# Altium integrated library Weidmueller_OMNIMATE_Power.IntLib: 508 symbols (part 1 of 9)
Pins are listed as number, name and electrical type; pins without a type are passive.

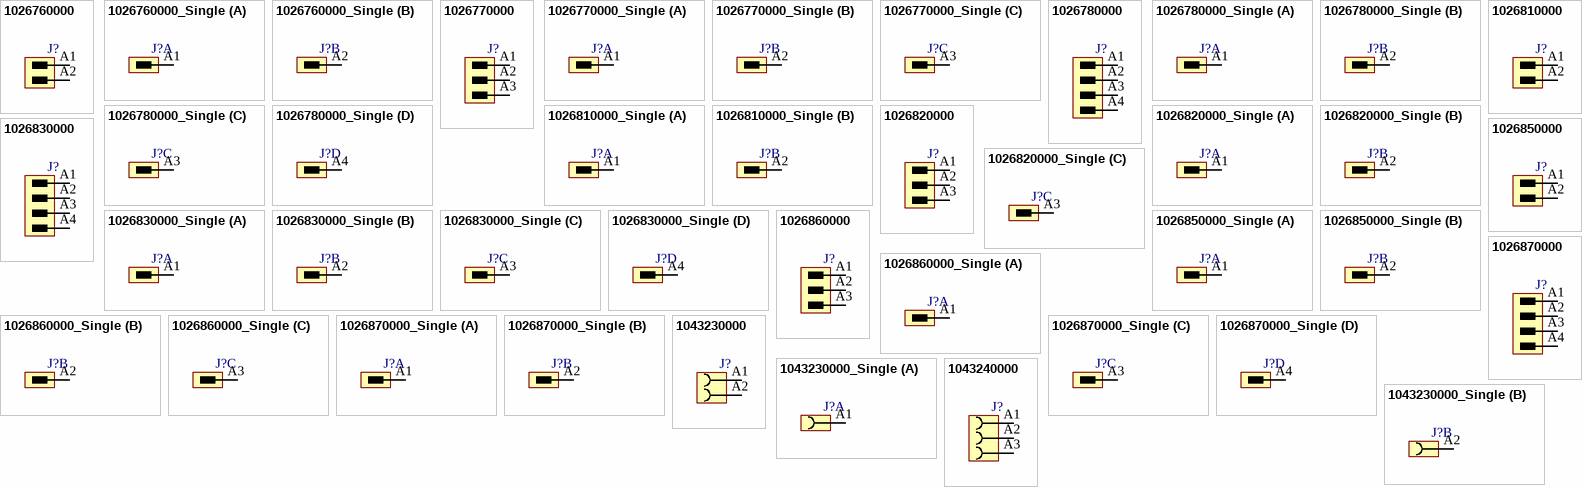
[diagram p0: symbols 1026760000 to 1043240000]

## 1026760000
designator J?
OMNIMATE Power - series BL/SL 7.62HP; PartNumber: 1026760000; Manufacturer: Weidmueller; Short_text_for_material: SL 7.62HP/02/90G 3.2SN BK BX; Side_termination_characteristic: closed side; Mounting_onto_the_PCB: Solder connection; Pitch_mm: 7.62 mm; Pitch_inch: 0.3 inch; No_of_poles: 2; Outgoing_elbow: 90°; Solder_pin_length_mm: 3.2 mm; Contact_material: Cu-Leg; Contact_surface: tinned; Insulating_material: PBT; UL_94_flammability_rating: V-0; Rated_voltage_for_surge_voltage_class_pollution_degree_II_2: 630 V; Rated_voltage_use_group_B_UL_1059: 300 V; Rated_current_use_group_B_UL_1059: 20 A; PackageReference: SL_7_62HP_90G_02; Colour: Black; Packaging: Box; Qty: 100 PCS; Revision: V1; ComponentLink1Description: Manufacturer URL; ComponentLink1URL: http://www.weidmueller.com/; ComponentLink2Description: URL Link1; ComponentLink2URL: http://catalog.weidmueller.com/catalog/Start.do?localeId=en&ObjectID=1026760000
footprint SL_7_62HP_90G_02 (OMNIMATE Power - Serie BL/SL 7.62HP  SL 7.62HP/02/90G 3.2)
pins: A1, A2

## 1026760000_Single
designator J?
OMNIMATE Power - series BL/SL 7.62HP; PartNumber: 1026760000; Manufacturer: Weidmueller; Short_text_for_material: SL 7.62HP/02/90G 3.2SN BK BX; Side_termination_characteristic: closed side; Mounting_onto_the_PCB: Solder connection; Pitch_mm: 7.62 mm; Pitch_inch: 0.3 inch; No_of_poles: 2; Outgoing_elbow: 90°; Solder_pin_length_mm: 3.2 mm; Contact_material: Cu-Leg; Contact_surface: tinned; Insulating_material: PBT; UL_94_flammability_rating: V-0; Rated_voltage_for_surge_voltage_class_pollution_degree_II_2: 630 V; Rated_voltage_use_group_B_UL_1059: 300 V; Rated_current_use_group_B_UL_1059: 20 A; PackageReference: SL_7_62HP_90G_02; Colour: Black; Packaging: Box; Qty: 100 PCS; Revision: V1; ComponentLink1Description: Manufacturer URL; ComponentLink1URL: http://www.weidmueller.com/; ComponentLink2Description: URL Link1; ComponentLink2URL: http://catalog.weidmueller.com/catalog/Start.do?localeId=en&ObjectID=1026760000
footprint SL_7_62HP_90G_02 (OMNIMATE Power - Serie BL/SL 7.62HP  SL 7.62HP/02/90G 3.2)
part A pins: A1
part B pins: A2

## 1026770000
designator J?
OMNIMATE Power - series BL/SL 7.62HP; PartNumber: 1026770000; Manufacturer: Weidmueller; Short_text_for_material: SL 7.62HP/03/90G 3.2SN BK BX; Side_termination_characteristic: closed side; Mounting_onto_the_PCB: Solder connection; Pitch_mm: 7.62 mm; Pitch_inch: 0.3 inch; No_of_poles: 3; Outgoing_elbow: 90°; Solder_pin_length_mm: 3.2 mm; Contact_material: Cu-Leg; Contact_surface: tinned; Insulating_material: PBT; UL_94_flammability_rating: V-0; Rated_voltage_for_surge_voltage_class_pollution_degree_II_2: 630 V; Rated_voltage_use_group_B_UL_1059: 300 V; Rated_current_use_group_B_UL_1059: 20 A; PackageReference: SL_7_62HP_90G_03; Colour: Black; Packaging: Box; Qty: 100 PCS; Revision: V1; ComponentLink1Description: Manufacturer URL; ComponentLink1URL: http://www.weidmueller.com/; ComponentLink2Description: URL Link1; ComponentLink2URL: http://catalog.weidmueller.com/catalog/Start.do?localeId=en&ObjectID=1026770000
footprint SL_7_62HP_90G_03 (OMNIMATE Power - Serie BL/SL 7.62HP  SL 7.62HP/03/90G 3.2)
pins: A1, A2, A3

## 1026770000_Single
designator J?
OMNIMATE Power - series BL/SL 7.62HP; PartNumber: 1026770000; Manufacturer: Weidmueller; Short_text_for_material: SL 7.62HP/03/90G 3.2SN BK BX; Side_termination_characteristic: closed side; Mounting_onto_the_PCB: Solder connection; Pitch_mm: 7.62 mm; Pitch_inch: 0.3 inch; No_of_poles: 3; Outgoing_elbow: 90°; Solder_pin_length_mm: 3.2 mm; Contact_material: Cu-Leg; Contact_surface: tinned; Insulating_material: PBT; UL_94_flammability_rating: V-0; Rated_voltage_for_surge_voltage_class_pollution_degree_II_2: 630 V; Rated_voltage_use_group_B_UL_1059: 300 V; Rated_current_use_group_B_UL_1059: 20 A; PackageReference: SL_7_62HP_90G_03; Colour: Black; Packaging: Box; Qty: 100 PCS; Revision: V1; ComponentLink1Description: Manufacturer URL; ComponentLink1URL: http://www.weidmueller.com/; ComponentLink2Description: URL Link1; ComponentLink2URL: http://catalog.weidmueller.com/catalog/Start.do?localeId=en&ObjectID=1026770000
footprint SL_7_62HP_90G_03 (OMNIMATE Power - Serie BL/SL 7.62HP  SL 7.62HP/03/90G 3.2)
part A pins: A1
part B pins: A2
part C pins: A3

## 1026780000
designator J?
OMNIMATE Power - series BL/SL 7.62HP; PartNumber: 1026780000; Manufacturer: Weidmueller; Short_text_for_material: SL 7.62HP/04/90G 3.2SN BK BX; Side_termination_characteristic: closed side; Mounting_onto_the_PCB: Solder connection; Pitch_mm: 7.62 mm; Pitch_inch: 0.3 inch; No_of_poles: 4; Outgoing_elbow: 90°; Solder_pin_length_mm: 3.2 mm; Contact_material: Cu-Leg; Contact_surface: tinned; Insulating_material: PBT; UL_94_flammability_rating: V-0; Rated_voltage_for_surge_voltage_class_pollution_degree_II_2: 630 V; Rated_voltage_use_group_B_UL_1059: 300 V; Rated_current_use_group_B_UL_1059: 20 A; PackageReference: SL_7_62HP_90G_04; Colour: Black; Packaging: Box; Qty: 100 PCS; Revision: V1; ComponentLink1Description: Manufacturer URL; ComponentLink1URL: http://www.weidmueller.com/; ComponentLink2Description: URL Link1; ComponentLink2URL: http://catalog.weidmueller.com/catalog/Start.do?localeId=en&ObjectID=1026780000
footprint SL_7_62HP_90G_04 (OMNIMATE Power - Serie BL/SL 7.62HP  SL 7.62HP/04/90G 3.2)
pins: A1, A2, A3, A4

## 1026780000_Single
designator J?
OMNIMATE Power - series BL/SL 7.62HP; PartNumber: 1026780000; Manufacturer: Weidmueller; Short_text_for_material: SL 7.62HP/04/90G 3.2SN BK BX; Side_termination_characteristic: closed side; Mounting_onto_the_PCB: Solder connection; Pitch_mm: 7.62 mm; Pitch_inch: 0.3 inch; No_of_poles: 4; Outgoing_elbow: 90°; Solder_pin_length_mm: 3.2 mm; Contact_material: Cu-Leg; Contact_surface: tinned; Insulating_material: PBT; UL_94_flammability_rating: V-0; Rated_voltage_for_surge_voltage_class_pollution_degree_II_2: 630 V; Rated_voltage_use_group_B_UL_1059: 300 V; Rated_current_use_group_B_UL_1059: 20 A; PackageReference: SL_7_62HP_90G_04; Colour: Black; Packaging: Box; Qty: 100 PCS; Revision: V1; ComponentLink1Description: Manufacturer URL; ComponentLink1URL: http://www.weidmueller.com/; ComponentLink2Description: URL Link1; ComponentLink2URL: http://catalog.weidmueller.com/catalog/Start.do?localeId=en&ObjectID=1026780000
footprint SL_7_62HP_90G_04 (OMNIMATE Power - Serie BL/SL 7.62HP  SL 7.62HP/04/90G 3.2)
part A pins: A1
part B pins: A2
part C pins: A3
part D pins: A4

## 1026810000
designator J?
OMNIMATE Power - series BL/SL 7.62HP; PartNumber: 1026810000; Manufacturer: Weidmueller; Short_text_for_material: SL 7.62HP/02/90F 3.2 SN OR BX; Side_termination_characteristic: Flange; Mounting_onto_the_PCB: Solder connection; Pitch_mm: 7.62 mm; Pitch_inch: 0.3 inch; No_of_poles: 2; Outgoing_elbow: 90°; Solder_pin_length_mm: 3.2 mm; Contact_surface: tinned; Insulating_material: PBT; UL_94_flammability_rating: V-0; Rated_voltage_for_surge_voltage_class_pollution_degree_II_2: 630 V; Rated_current_min_no_of_poles_TU_20_deg_C: 29 A; Rated_voltage_use_group_B_UL_1059: 300 V; Rated_current_use_group_B_UL_1059: 20 A; PackageReference: SL_7_62HP_90F_02; Colour: Orange; Packaging: Box; Qty: 100 PCS; Revision: V1; ComponentLink1Description: Manufacturer URL; ComponentLink1URL: http://www.weidmueller.com/; ComponentLink2Description: URL Link1; ComponentLink2URL: http://catalog.weidmueller.com/catalog/Start.do?localeId=en&ObjectID=1026810000
footprint SL_7_62HP_90F_02 (OMNIMATE Power - Serie BL/SL 7.62HP  SL 7.62HP/02/90F 3.2)
pins: A1, A2

## 1026810000_Single
designator J?
OMNIMATE Power - series BL/SL 7.62HP; PartNumber: 1026810000; Manufacturer: Weidmueller; Short_text_for_material: SL 7.62HP/02/90F 3.2 SN OR BX; Side_termination_characteristic: Flange; Mounting_onto_the_PCB: Solder connection; Pitch_mm: 7.62 mm; Pitch_inch: 0.3 inch; No_of_poles: 2; Outgoing_elbow: 90°; Solder_pin_length_mm: 3.2 mm; Contact_surface: tinned; Insulating_material: PBT; UL_94_flammability_rating: V-0; Rated_voltage_for_surge_voltage_class_pollution_degree_II_2: 630 V; Rated_current_min_no_of_poles_TU_20_deg_C: 29 A; Rated_voltage_use_group_B_UL_1059: 300 V; Rated_current_use_group_B_UL_1059: 20 A; PackageReference: SL_7_62HP_90F_02; Colour: Orange; Packaging: Box; Qty: 100 PCS; Revision: V1; ComponentLink1Description: Manufacturer URL; ComponentLink1URL: http://www.weidmueller.com/; ComponentLink2Description: URL Link1; ComponentLink2URL: http://catalog.weidmueller.com/catalog/Start.do?localeId=en&ObjectID=1026810000
footprint SL_7_62HP_90F_02 (OMNIMATE Power - Serie BL/SL 7.62HP  SL 7.62HP/02/90F 3.2)
part A pins: A1
part B pins: A2

## 1026820000
designator J?
OMNIMATE Power - series BL/SL 7.62HP; PartNumber: 1026820000; Manufacturer: Weidmueller; Short_text_for_material: SL 7.62HP/03/90F 3.2 SN OR BX; Side_termination_characteristic: Flange; Mounting_onto_the_PCB: Solder connection; Pitch_mm: 7.62 mm; Pitch_inch: 0.3 inch; No_of_poles: 3; Outgoing_elbow: 90°; Solder_pin_length_mm: 3.2 mm; Contact_surface: tinned; Insulating_material: PBT; UL_94_flammability_rating: V-0; Rated_voltage_for_surge_voltage_class_pollution_degree_II_2: 630 V; Rated_current_min_no_of_poles_TU_20_deg_C: 29 A; Rated_voltage_use_group_B_UL_1059: 300 V; Rated_current_use_group_B_UL_1059: 20 A; PackageReference: SL_7_62HP_90F_03; Colour: Orange; Packaging: Box; Qty: 100 PCS; Revision: V1; ComponentLink1Description: Manufacturer URL; ComponentLink1URL: http://www.weidmueller.com/; ComponentLink2Description: URL Link1; ComponentLink2URL: http://catalog.weidmueller.com/catalog/Start.do?localeId=en&ObjectID=1026820000
footprint SL_7_62HP_90F_03 (OMNIMATE Power - Serie BL/SL 7.62HP  SL 7.62HP/03/90F 3.2)
pins: A1, A2, A3

## 1026820000_Single
designator J?
OMNIMATE Power - series BL/SL 7.62HP; PartNumber: 1026820000; Manufacturer: Weidmueller; Short_text_for_material: SL 7.62HP/03/90F 3.2 SN OR BX; Side_termination_characteristic: Flange; Mounting_onto_the_PCB: Solder connection; Pitch_mm: 7.62 mm; Pitch_inch: 0.3 inch; No_of_poles: 3; Outgoing_elbow: 90°; Solder_pin_length_mm: 3.2 mm; Contact_surface: tinned; Insulating_material: PBT; UL_94_flammability_rating: V-0; Rated_voltage_for_surge_voltage_class_pollution_degree_II_2: 630 V; Rated_current_min_no_of_poles_TU_20_deg_C: 29 A; Rated_voltage_use_group_B_UL_1059: 300 V; Rated_current_use_group_B_UL_1059: 20 A; PackageReference: SL_7_62HP_90F_03; Colour: Orange; Packaging: Box; Qty: 100 PCS; Revision: V1; ComponentLink1Description: Manufacturer URL; ComponentLink1URL: http://www.weidmueller.com/; ComponentLink2Description: URL Link1; ComponentLink2URL: http://catalog.weidmueller.com/catalog/Start.do?localeId=en&ObjectID=1026820000
footprint SL_7_62HP_90F_03 (OMNIMATE Power - Serie BL/SL 7.62HP  SL 7.62HP/03/90F 3.2)
part A pins: A1
part B pins: A2
part C pins: A3

## 1026830000
designator J?
OMNIMATE Power - series BL/SL 7.62HP; PartNumber: 1026830000; Manufacturer: Weidmueller; Short_text_for_material: SL 7.62HP/04/90F 3.2 SN OR BX; Side_termination_characteristic: Flange; Mounting_onto_the_PCB: Solder connection; Pitch_mm: 7.62 mm; Pitch_inch: 0.3 inch; No_of_poles: 4; Outgoing_elbow: 90°; Solder_pin_length_mm: 3.2 mm; Contact_surface: tinned; Insulating_material: PBT; UL_94_flammability_rating: V-0; Rated_voltage_for_surge_voltage_class_pollution_degree_II_2: 630 V; Rated_current_min_no_of_poles_TU_20_deg_C: 29 A; Rated_voltage_use_group_B_UL_1059: 300 V; Rated_current_use_group_B_UL_1059: 20 A; PackageReference: SL_7_62HP_90F_04; Colour: Orange; Packaging: Box; Qty: 100 PCS; Revision: V1; ComponentLink1Description: Manufacturer URL; ComponentLink1URL: http://www.weidmueller.com/; ComponentLink2Description: URL Link1; ComponentLink2URL: http://catalog.weidmueller.com/catalog/Start.do?localeId=en&ObjectID=1026830000
footprint SL_7_62HP_90F_04 (OMNIMATE Power - Serie BL/SL 7.62HP  SL 7.62HP/04/90F 3.2)
pins: A1, A2, A3, A4

## 1026830000_Single
designator J?
OMNIMATE Power - series BL/SL 7.62HP; PartNumber: 1026830000; Manufacturer: Weidmueller; Short_text_for_material: SL 7.62HP/04/90F 3.2 SN OR BX; Side_termination_characteristic: Flange; Mounting_onto_the_PCB: Solder connection; Pitch_mm: 7.62 mm; Pitch_inch: 0.3 inch; No_of_poles: 4; Outgoing_elbow: 90°; Solder_pin_length_mm: 3.2 mm; Contact_surface: tinned; Insulating_material: PBT; UL_94_flammability_rating: V-0; Rated_voltage_for_surge_voltage_class_pollution_degree_II_2: 630 V; Rated_current_min_no_of_poles_TU_20_deg_C: 29 A; Rated_voltage_use_group_B_UL_1059: 300 V; Rated_current_use_group_B_UL_1059: 20 A; PackageReference: SL_7_62HP_90F_04; Colour: Orange; Packaging: Box; Qty: 100 PCS; Revision: V1; ComponentLink1Description: Manufacturer URL; ComponentLink1URL: http://www.weidmueller.com/; ComponentLink2Description: URL Link1; ComponentLink2URL: http://catalog.weidmueller.com/catalog/Start.do?localeId=en&ObjectID=1026830000
footprint SL_7_62HP_90F_04 (OMNIMATE Power - Serie BL/SL 7.62HP  SL 7.62HP/04/90F 3.2)
part A pins: A1
part B pins: A2
part C pins: A3
part D pins: A4

## 1026850000
designator J?
OMNIMATE Power - series BL/SL 7.62HP; PartNumber: 1026850000; Manufacturer: Weidmueller; Short_text_for_material: SL 7.62HP/02/90F 3.2 SN BK BX; Side_termination_characteristic: Flange; Mounting_onto_the_PCB: Solder connection; Pitch_mm: 7.62 mm; Pitch_inch: 0.3 inch; No_of_poles: 2; Outgoing_elbow: 90°; Solder_pin_length_mm: 3.2 mm; Contact_material: Cu-Leg; Contact_surface: tinned; Insulating_material: PBT; UL_94_flammability_rating: V-0; Rated_voltage_for_surge_voltage_class_pollution_degree_II_2: 630 V; Rated_voltage_use_group_B_UL_1059: 300 V; Rated_current_use_group_B_UL_1059: 20 A; PackageReference: SL_7_62HP_90F_02; Colour: Black; Packaging: Box; Qty: 100 PCS; Revision: V1; ComponentLink1Description: Manufacturer URL; ComponentLink1URL: http://www.weidmueller.com/; ComponentLink2Description: URL Link1; ComponentLink2URL: http://catalog.weidmueller.com/catalog/Start.do?localeId=en&ObjectID=1026850000
footprint SL_7_62HP_90F_02 (OMNIMATE Power - Serie BL/SL 7.62HP  SL 7.62HP/02/90F 3.2)
pins: A1, A2

## 1026850000_Single
designator J?
OMNIMATE Power - series BL/SL 7.62HP; PartNumber: 1026850000; Manufacturer: Weidmueller; Short_text_for_material: SL 7.62HP/02/90F 3.2 SN BK BX; Side_termination_characteristic: Flange; Mounting_onto_the_PCB: Solder connection; Pitch_mm: 7.62 mm; Pitch_inch: 0.3 inch; No_of_poles: 2; Outgoing_elbow: 90°; Solder_pin_length_mm: 3.2 mm; Contact_material: Cu-Leg; Contact_surface: tinned; Insulating_material: PBT; UL_94_flammability_rating: V-0; Rated_voltage_for_surge_voltage_class_pollution_degree_II_2: 630 V; Rated_voltage_use_group_B_UL_1059: 300 V; Rated_current_use_group_B_UL_1059: 20 A; PackageReference: SL_7_62HP_90F_02; Colour: Black; Packaging: Box; Qty: 100 PCS; Revision: V1; ComponentLink1Description: Manufacturer URL; ComponentLink1URL: http://www.weidmueller.com/; ComponentLink2Description: URL Link1; ComponentLink2URL: http://catalog.weidmueller.com/catalog/Start.do?localeId=en&ObjectID=1026850000
footprint SL_7_62HP_90F_02 (OMNIMATE Power - Serie BL/SL 7.62HP  SL 7.62HP/02/90F 3.2)
part A pins: A1
part B pins: A2

## 1026860000
designator J?
OMNIMATE Power - series BL/SL 7.62HP; PartNumber: 1026860000; Manufacturer: Weidmueller; Short_text_for_material: SL 7.62HP/03/90F 3.2 SN BK BX; Side_termination_characteristic: Flange; Mounting_onto_the_PCB: Solder connection; Pitch_mm: 7.62 mm; Pitch_inch: 0.3 inch; No_of_poles: 3; Outgoing_elbow: 90°; Solder_pin_length_mm: 3.2 mm; Contact_material: Cu-Leg; Contact_surface: tinned; Insulating_material: PBT; UL_94_flammability_rating: V-0; Rated_voltage_for_surge_voltage_class_pollution_degree_II_2: 630 V; Rated_voltage_use_group_B_UL_1059: 300 V; Rated_current_use_group_B_UL_1059: 20 A; PackageReference: SL_7_62HP_90F_03; Colour: Black; Packaging: Box; Qty: 100 PCS; Revision: V1; ComponentLink1Description: Manufacturer URL; ComponentLink1URL: http://www.weidmueller.com/; ComponentLink2Description: URL Link1; ComponentLink2URL: http://catalog.weidmueller.com/catalog/Start.do?localeId=en&ObjectID=1026860000
footprint SL_7_62HP_90F_03 (OMNIMATE Power - Serie BL/SL 7.62HP  SL 7.62HP/03/90F 3.2)
pins: A1, A2, A3

## 1026860000_Single
designator J?
OMNIMATE Power - series BL/SL 7.62HP; PartNumber: 1026860000; Manufacturer: Weidmueller; Short_text_for_material: SL 7.62HP/03/90F 3.2 SN BK BX; Side_termination_characteristic: Flange; Mounting_onto_the_PCB: Solder connection; Pitch_mm: 7.62 mm; Pitch_inch: 0.3 inch; No_of_poles: 3; Outgoing_elbow: 90°; Solder_pin_length_mm: 3.2 mm; Contact_material: Cu-Leg; Contact_surface: tinned; Insulating_material: PBT; UL_94_flammability_rating: V-0; Rated_voltage_for_surge_voltage_class_pollution_degree_II_2: 630 V; Rated_voltage_use_group_B_UL_1059: 300 V; Rated_current_use_group_B_UL_1059: 20 A; PackageReference: SL_7_62HP_90F_03; Colour: Black; Packaging: Box; Qty: 100 PCS; Revision: V1; ComponentLink1Description: Manufacturer URL; ComponentLink1URL: http://www.weidmueller.com/; ComponentLink2Description: URL Link1; ComponentLink2URL: http://catalog.weidmueller.com/catalog/Start.do?localeId=en&ObjectID=1026860000
footprint SL_7_62HP_90F_03 (OMNIMATE Power - Serie BL/SL 7.62HP  SL 7.62HP/03/90F 3.2)
part A pins: A1
part B pins: A2
part C pins: A3

## 1026870000
designator J?
OMNIMATE Power - series BL/SL 7.62HP; PartNumber: 1026870000; Manufacturer: Weidmueller; Short_text_for_material: SL 7.62HP/04/90F 3.2 SN BK BX; Side_termination_characteristic: Flange; Mounting_onto_the_PCB: Solder connection; Pitch_mm: 7.62 mm; Pitch_inch: 0.3 inch; No_of_poles: 4; Outgoing_elbow: 90°; Solder_pin_length_mm: 3.2 mm; Contact_material: Cu-Leg; Contact_surface: tinned; Insulating_material: PBT; UL_94_flammability_rating: V-0; Rated_voltage_for_surge_voltage_class_pollution_degree_II_2: 630 V; Rated_voltage_use_group_B_UL_1059: 300 V; Rated_current_use_group_B_UL_1059: 20 A; PackageReference: SL_7_62HP_90F_04; Colour: Black; Packaging: Box; Qty: 100 PCS; Revision: V1; ComponentLink1Description: Manufacturer URL; ComponentLink1URL: http://www.weidmueller.com/; ComponentLink2Description: URL Link1; ComponentLink2URL: http://catalog.weidmueller.com/catalog/Start.do?localeId=en&ObjectID=1026870000
footprint SL_7_62HP_90F_04 (OMNIMATE Power - Serie BL/SL 7.62HP  SL 7.62HP/04/90F 3.2)
pins: A1, A2, A3, A4

## 1026870000_Single
designator J?
OMNIMATE Power - series BL/SL 7.62HP; PartNumber: 1026870000; Manufacturer: Weidmueller; Short_text_for_material: SL 7.62HP/04/90F 3.2 SN BK BX; Side_termination_characteristic: Flange; Mounting_onto_the_PCB: Solder connection; Pitch_mm: 7.62 mm; Pitch_inch: 0.3 inch; No_of_poles: 4; Outgoing_elbow: 90°; Solder_pin_length_mm: 3.2 mm; Contact_material: Cu-Leg; Contact_surface: tinned; Insulating_material: PBT; UL_94_flammability_rating: V-0; Rated_voltage_for_surge_voltage_class_pollution_degree_II_2: 630 V; Rated_voltage_use_group_B_UL_1059: 300 V; Rated_current_use_group_B_UL_1059: 20 A; PackageReference: SL_7_62HP_90F_04; Colour: Black; Packaging: Box; Qty: 100 PCS; Revision: V1; ComponentLink1Description: Manufacturer URL; ComponentLink1URL: http://www.weidmueller.com/; ComponentLink2Description: URL Link1; ComponentLink2URL: http://catalog.weidmueller.com/catalog/Start.do?localeId=en&ObjectID=1026870000
footprint SL_7_62HP_90F_04 (OMNIMATE Power - Serie BL/SL 7.62HP  SL 7.62HP/04/90F 3.2)
part A pins: A1
part B pins: A2
part C pins: A3
part D pins: A4

## 1043230000
designator J?
OMNIMATE Power - series BL/SL 7.62HP; PartNumber: 1043230000; Manufacturer: Weidmueller; Short_text_for_material: BLL 7.62HP/02/90 3.2SN BK BX; Side_termination_characteristic: closed side; Mounting_onto_the_PCB: Solder connection; Pitch_mm: 7.62 mm; Pitch_inch: 0.3 inch; No_of_poles: 2; Outgoing_elbow: 90°; Solder_pin_length_mm: 3.2 mm; Contact_material: Cu-Leg; Contact_surface: tinned; Insulating_material: PA GF; UL_94_flammability_rating: V-0; Rated_voltage_for_surge_voltage_class_pollution_degree_II_2: 630 V; Rated_voltage_use_group_B_UL_1059: 300 V; Rated_current_use_group_B_UL_1059: 20 A; PackageReference: BLL_7_62HP_90G_02; Colour: Black; Packaging: Box; Qty: 126 PCS; Revision: V1; ComponentLink1Description: Manufacturer URL; ComponentLink1URL: http://www.weidmueller.com/; ComponentLink2Description: URL Link1; ComponentLink2URL: http://catalog.weidmueller.com/catalog/Start.do?localeId=en&ObjectID=1043230000
footprint BLL_7_62HP_90G_02 (OMNIMATE Power - Serie BL/SL 7.62HP  BLL 7.62HP/02/90 3.2)
pins: A1, A2

## 1043230000_Single
designator J?
OMNIMATE Power - series BL/SL 7.62HP; PartNumber: 1043230000; Manufacturer: Weidmueller; Short_text_for_material: BLL 7.62HP/02/90 3.2SN BK BX; Side_termination_characteristic: closed side; Mounting_onto_the_PCB: Solder connection; Pitch_mm: 7.62 mm; Pitch_inch: 0.3 inch; No_of_poles: 2; Outgoing_elbow: 90°; Solder_pin_length_mm: 3.2 mm; Contact_material: Cu-Leg; Contact_surface: tinned; Insulating_material: PA GF; UL_94_flammability_rating: V-0; Rated_voltage_for_surge_voltage_class_pollution_degree_II_2: 630 V; Rated_voltage_use_group_B_UL_1059: 300 V; Rated_current_use_group_B_UL_1059: 20 A; PackageReference: BLL_7_62HP_90G_02; Colour: Black; Packaging: Box; Qty: 126 PCS; Revision: V1; ComponentLink1Description: Manufacturer URL; ComponentLink1URL: http://www.weidmueller.com/; ComponentLink2Description: URL Link1; ComponentLink2URL: http://catalog.weidmueller.com/catalog/Start.do?localeId=en&ObjectID=1043230000
footprint BLL_7_62HP_90G_02 (OMNIMATE Power - Serie BL/SL 7.62HP  BLL 7.62HP/02/90 3.2)
part A pins: A1
part B pins: A2

## 1043240000
designator J?
OMNIMATE Power - series BL/SL 7.62HP; PartNumber: 1043240000; Manufacturer: Weidmueller; Short_text_for_material: BLL 7.62HP/03/90 3.2SN BK BX; Side_termination_characteristic: closed side; Mounting_onto_the_PCB: Solder connection; Pitch_mm: 7.62 mm; Pitch_inch: 0.3 inch; No_of_poles: 3; Outgoing_elbow: 90°; Solder_pin_length_mm: 3.2 mm; Contact_material: Cu-Leg; Contact_surface: tinned; Insulating_material: PA GF; UL_94_flammability_rating: V-0; Rated_voltage_for_surge_voltage_class_pollution_degree_II_2: 630 V; Rated_voltage_use_group_B_UL_1059: 300 V; Rated_current_use_group_B_UL_1059: 20 A; PackageReference: BLL_7_62HP_90G_03; Colour: Black; Packaging: Box; Qty: 84 PCS; Revision: V1; ComponentLink1Description: Manufacturer URL; ComponentLink1URL: http://www.weidmueller.com/; ComponentLink2Description: URL Link1; ComponentLink2URL: http://catalog.weidmueller.com/catalog/Start.do?localeId=en&ObjectID=1043240000
footprint BLL_7_62HP_90G_03 (OMNIMATE Power - Serie BL/SL 7.62HP  BLL 7.62HP/03/90 3.2)
pins: A1, A2, A3

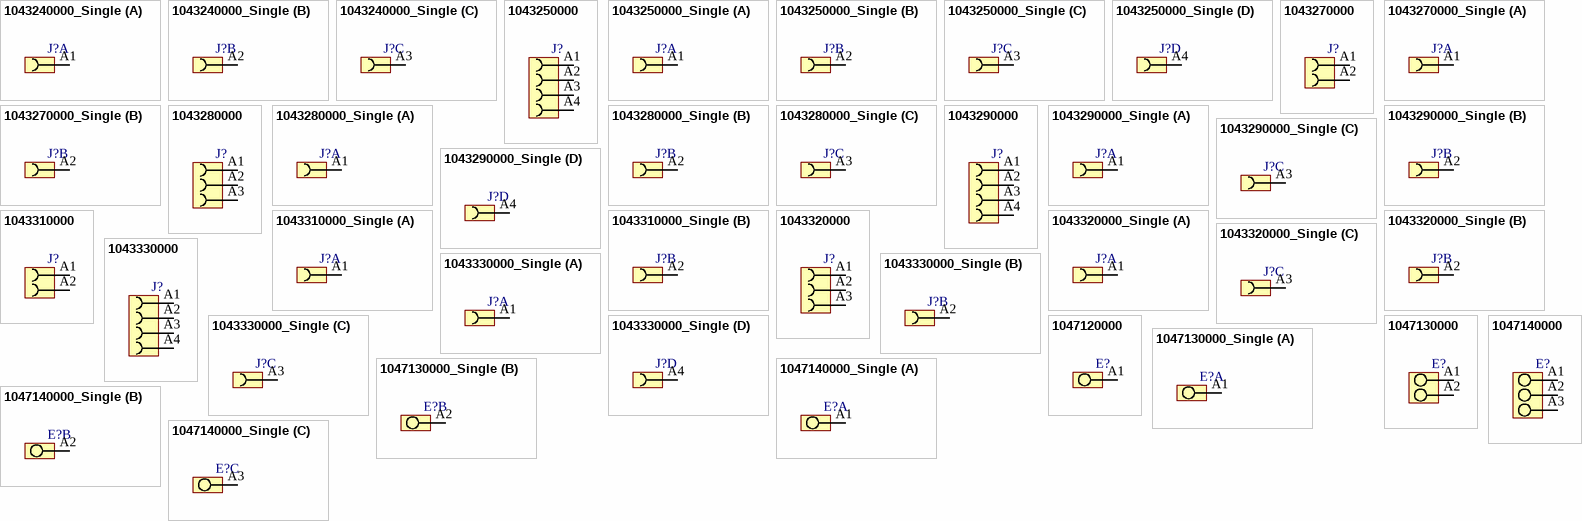
[diagram p1: symbols 1043240000_Single to 1047140000_Single]

## 1043240000_Single
designator J?
OMNIMATE Power - series BL/SL 7.62HP; PartNumber: 1043240000; Manufacturer: Weidmueller; Short_text_for_material: BLL 7.62HP/03/90 3.2SN BK BX; Side_termination_characteristic: closed side; Mounting_onto_the_PCB: Solder connection; Pitch_mm: 7.62 mm; Pitch_inch: 0.3 inch; No_of_poles: 3; Outgoing_elbow: 90°; Solder_pin_length_mm: 3.2 mm; Contact_material: Cu-Leg; Contact_surface: tinned; Insulating_material: PA GF; UL_94_flammability_rating: V-0; Rated_voltage_for_surge_voltage_class_pollution_degree_II_2: 630 V; Rated_voltage_use_group_B_UL_1059: 300 V; Rated_current_use_group_B_UL_1059: 20 A; PackageReference: BLL_7_62HP_90G_03; Colour: Black; Packaging: Box; Qty: 84 PCS; Revision: V1; ComponentLink1Description: Manufacturer URL; ComponentLink1URL: http://www.weidmueller.com/; ComponentLink2Description: URL Link1; ComponentLink2URL: http://catalog.weidmueller.com/catalog/Start.do?localeId=en&ObjectID=1043240000
footprint BLL_7_62HP_90G_03 (OMNIMATE Power - Serie BL/SL 7.62HP  BLL 7.62HP/03/90 3.2)
part A pins: A1
part B pins: A2
part C pins: A3

## 1043250000
designator J?
OMNIMATE Power - series BL/SL 7.62HP; PartNumber: 1043250000; Manufacturer: Weidmueller; Short_text_for_material: BLL 7.62HP/04/90 3.2SN BK BX; Side_termination_characteristic: closed side; Mounting_onto_the_PCB: Solder connection; Pitch_mm: 7.62 mm; Pitch_inch: 0.3 inch; No_of_poles: 4; Outgoing_elbow: 90°; Solder_pin_length_mm: 3.2 mm; Contact_material: Cu-Leg; Contact_surface: tinned; Insulating_material: PA GF; UL_94_flammability_rating: V-0; Rated_voltage_for_surge_voltage_class_pollution_degree_II_2: 630 V; Rated_voltage_use_group_B_UL_1059: 300 V; Rated_current_use_group_B_UL_1059: 20 A; PackageReference: BLL_7_62HP_90G_04; Colour: Black; Packaging: Box; Qty: 60 PCS; Revision: V1; ComponentLink1Description: Manufacturer URL; ComponentLink1URL: http://www.weidmueller.com/; ComponentLink2Description: URL Link1; ComponentLink2URL: http://catalog.weidmueller.com/catalog/Start.do?localeId=en&ObjectID=1043250000
footprint BLL_7_62HP_90G_04 (OMNIMATE Power - Serie BL/SL 7.62HP  BLL 7.62HP/04/90 3.2)
pins: A1, A2, A3, A4

## 1043250000_Single
designator J?
OMNIMATE Power - series BL/SL 7.62HP; PartNumber: 1043250000; Manufacturer: Weidmueller; Short_text_for_material: BLL 7.62HP/04/90 3.2SN BK BX; Side_termination_characteristic: closed side; Mounting_onto_the_PCB: Solder connection; Pitch_mm: 7.62 mm; Pitch_inch: 0.3 inch; No_of_poles: 4; Outgoing_elbow: 90°; Solder_pin_length_mm: 3.2 mm; Contact_material: Cu-Leg; Contact_surface: tinned; Insulating_material: PA GF; UL_94_flammability_rating: V-0; Rated_voltage_for_surge_voltage_class_pollution_degree_II_2: 630 V; Rated_voltage_use_group_B_UL_1059: 300 V; Rated_current_use_group_B_UL_1059: 20 A; PackageReference: BLL_7_62HP_90G_04; Colour: Black; Packaging: Box; Qty: 60 PCS; Revision: V1; ComponentLink1Description: Manufacturer URL; ComponentLink1URL: http://www.weidmueller.com/; ComponentLink2Description: URL Link1; ComponentLink2URL: http://catalog.weidmueller.com/catalog/Start.do?localeId=en&ObjectID=1043250000
footprint BLL_7_62HP_90G_04 (OMNIMATE Power - Serie BL/SL 7.62HP  BLL 7.62HP/04/90 3.2)
part A pins: A1
part B pins: A2
part C pins: A3
part D pins: A4

## 1043270000
designator J?
OMNIMATE Power - series BL/SL 7.62HP; PartNumber: 1043270000; Manufacturer: Weidmueller; Short_text_for_material: BLL 7.62HP/02/90F 3.2SN BK BX; Side_termination_characteristic: Flange; Mounting_onto_the_PCB: Solder connection; Pitch_mm: 7.62 mm; Pitch_inch: 0.3 inch; No_of_poles: 2; Outgoing_elbow: 90°; Solder_pin_length_mm: 3.2 mm; Contact_material: Cu-Leg; Contact_surface: tinned; Insulating_material: PA GF; UL_94_flammability_rating: V-0; Rated_voltage_for_surge_voltage_class_pollution_degree_II_2: 630 V; Rated_voltage_use_group_B_UL_1059: 300 V; Rated_current_use_group_B_UL_1059: 20 A; PackageReference: BLL_7_62HP_90F_02; Colour: Black; Packaging: Box; Qty: 72 PCS; Revision: V1; ComponentLink1Description: Manufacturer URL; ComponentLink1URL: http://www.weidmueller.com/; ComponentLink2Description: URL Link1; ComponentLink2URL: http://catalog.weidmueller.com/catalog/Start.do?localeId=en&ObjectID=1043270000
footprint BLL_7_62HP_90F_02 (OMNIMATE Power - Serie BL/SL 7.62HP  BLL 7.62HP/02/90F 3.2)
pins: A1, A2

## 1043270000_Single
designator J?
OMNIMATE Power - series BL/SL 7.62HP; PartNumber: 1043270000; Manufacturer: Weidmueller; Short_text_for_material: BLL 7.62HP/02/90F 3.2SN BK BX; Side_termination_characteristic: Flange; Mounting_onto_the_PCB: Solder connection; Pitch_mm: 7.62 mm; Pitch_inch: 0.3 inch; No_of_poles: 2; Outgoing_elbow: 90°; Solder_pin_length_mm: 3.2 mm; Contact_material: Cu-Leg; Contact_surface: tinned; Insulating_material: PA GF; UL_94_flammability_rating: V-0; Rated_voltage_for_surge_voltage_class_pollution_degree_II_2: 630 V; Rated_voltage_use_group_B_UL_1059: 300 V; Rated_current_use_group_B_UL_1059: 20 A; PackageReference: BLL_7_62HP_90F_02; Colour: Black; Packaging: Box; Qty: 72 PCS; Revision: V1; ComponentLink1Description: Manufacturer URL; ComponentLink1URL: http://www.weidmueller.com/; ComponentLink2Description: URL Link1; ComponentLink2URL: http://catalog.weidmueller.com/catalog/Start.do?localeId=en&ObjectID=1043270000
footprint BLL_7_62HP_90F_02 (OMNIMATE Power - Serie BL/SL 7.62HP  BLL 7.62HP/02/90F 3.2)
part A pins: A1
part B pins: A2

## 1043280000
designator J?
OMNIMATE Power - series BL/SL 7.62HP; PartNumber: 1043280000; Manufacturer: Weidmueller; Short_text_for_material: BLL 7.62HP/03/90F 3.2SN BK BX; Side_termination_characteristic: Flange; Mounting_onto_the_PCB: Solder connection; Pitch_mm: 7.62 mm; Pitch_inch: 0.3 inch; No_of_poles: 3; Outgoing_elbow: 90°; Solder_pin_length_mm: 3.2 mm; Contact_material: Cu-Leg; Contact_surface: tinned; Insulating_material: PA GF; UL_94_flammability_rating: V-0; Rated_voltage_for_surge_voltage_class_pollution_degree_II_2: 630 V; Rated_voltage_use_group_B_UL_1059: 300 V; Rated_current_use_group_B_UL_1059: 20 A; PackageReference: BLL_7_62HP_90F_03; Colour: Black; Packaging: Box; Qty: 54 PCS; Revision: V1; ComponentLink1Description: Manufacturer URL; ComponentLink1URL: http://www.weidmueller.com/; ComponentLink2Description: URL Link1; ComponentLink2URL: http://catalog.weidmueller.com/catalog/Start.do?localeId=en&ObjectID=1043280000
footprint BLL_7_62HP_90F_03 (OMNIMATE Power - Serie BL/SL 7.62HP  BLL 7.62HP/03/90F 3.2)
pins: A1, A2, A3

## 1043280000_Single
designator J?
OMNIMATE Power - series BL/SL 7.62HP; PartNumber: 1043280000; Manufacturer: Weidmueller; Short_text_for_material: BLL 7.62HP/03/90F 3.2SN BK BX; Side_termination_characteristic: Flange; Mounting_onto_the_PCB: Solder connection; Pitch_mm: 7.62 mm; Pitch_inch: 0.3 inch; No_of_poles: 3; Outgoing_elbow: 90°; Solder_pin_length_mm: 3.2 mm; Contact_material: Cu-Leg; Contact_surface: tinned; Insulating_material: PA GF; UL_94_flammability_rating: V-0; Rated_voltage_for_surge_voltage_class_pollution_degree_II_2: 630 V; Rated_voltage_use_group_B_UL_1059: 300 V; Rated_current_use_group_B_UL_1059: 20 A; PackageReference: BLL_7_62HP_90F_03; Colour: Black; Packaging: Box; Qty: 54 PCS; Revision: V1; ComponentLink1Description: Manufacturer URL; ComponentLink1URL: http://www.weidmueller.com/; ComponentLink2Description: URL Link1; ComponentLink2URL: http://catalog.weidmueller.com/catalog/Start.do?localeId=en&ObjectID=1043280000
footprint BLL_7_62HP_90F_03 (OMNIMATE Power - Serie BL/SL 7.62HP  BLL 7.62HP/03/90F 3.2)
part A pins: A1
part B pins: A2
part C pins: A3

## 1043290000
designator J?
OMNIMATE Power - series BL/SL 7.62HP; PartNumber: 1043290000; Manufacturer: Weidmueller; Short_text_for_material: BLL 7.62HP/04/90F 3.2SN BK BX; Side_termination_characteristic: Flange; Mounting_onto_the_PCB: Solder connection; Pitch_mm: 7.62 mm; Pitch_inch: 0.3 inch; No_of_poles: 4; Outgoing_elbow: 90°; Solder_pin_length_mm: 3.2 mm; Contact_material: Cu-Leg; Contact_surface: tinned; Insulating_material: PA GF; UL_94_flammability_rating: V-0; Rated_voltage_for_surge_voltage_class_pollution_degree_II_2: 630 V; Rated_voltage_use_group_B_UL_1059: 300 V; Rated_current_use_group_B_UL_1059: 20 A; PackageReference: BLL_7_62HP_90F_04; Colour: Black; Packaging: Box; Qty: 42 PCS; Revision: V1; ComponentLink1Description: Manufacturer URL; ComponentLink1URL: http://www.weidmueller.com/; ComponentLink2Description: URL Link1; ComponentLink2URL: http://catalog.weidmueller.com/catalog/Start.do?localeId=en&ObjectID=1043290000
footprint BLL_7_62HP_90F_04 (OMNIMATE Power - Serie BL/SL 7.62HP  BLL 7.62HP/04/90F 3.2)
pins: A1, A2, A3, A4

## 1043290000_Single
designator J?
OMNIMATE Power - series BL/SL 7.62HP; PartNumber: 1043290000; Manufacturer: Weidmueller; Short_text_for_material: BLL 7.62HP/04/90F 3.2SN BK BX; Side_termination_characteristic: Flange; Mounting_onto_the_PCB: Solder connection; Pitch_mm: 7.62 mm; Pitch_inch: 0.3 inch; No_of_poles: 4; Outgoing_elbow: 90°; Solder_pin_length_mm: 3.2 mm; Contact_material: Cu-Leg; Contact_surface: tinned; Insulating_material: PA GF; UL_94_flammability_rating: V-0; Rated_voltage_for_surge_voltage_class_pollution_degree_II_2: 630 V; Rated_voltage_use_group_B_UL_1059: 300 V; Rated_current_use_group_B_UL_1059: 20 A; PackageReference: BLL_7_62HP_90F_04; Colour: Black; Packaging: Box; Qty: 42 PCS; Revision: V1; ComponentLink1Description: Manufacturer URL; ComponentLink1URL: http://www.weidmueller.com/; ComponentLink2Description: URL Link1; ComponentLink2URL: http://catalog.weidmueller.com/catalog/Start.do?localeId=en&ObjectID=1043290000
footprint BLL_7_62HP_90F_04 (OMNIMATE Power - Serie BL/SL 7.62HP  BLL 7.62HP/04/90F 3.2)
part A pins: A1
part B pins: A2
part C pins: A3
part D pins: A4

## 1043310000
designator J?